# Altium footprint library adafruit.PCBLIB: 648 footprints (part 41 of 41)
Each footprint in its own frame and in the unit in brackets; x right, y up, seen from the top. Pads: shape width x height; smd on the part's side, far side on the other; paste and mask are expansions set on the pad; w line width, h text height; cw(c..) or ccw(c..) is an arc to the next point about the centre after c.
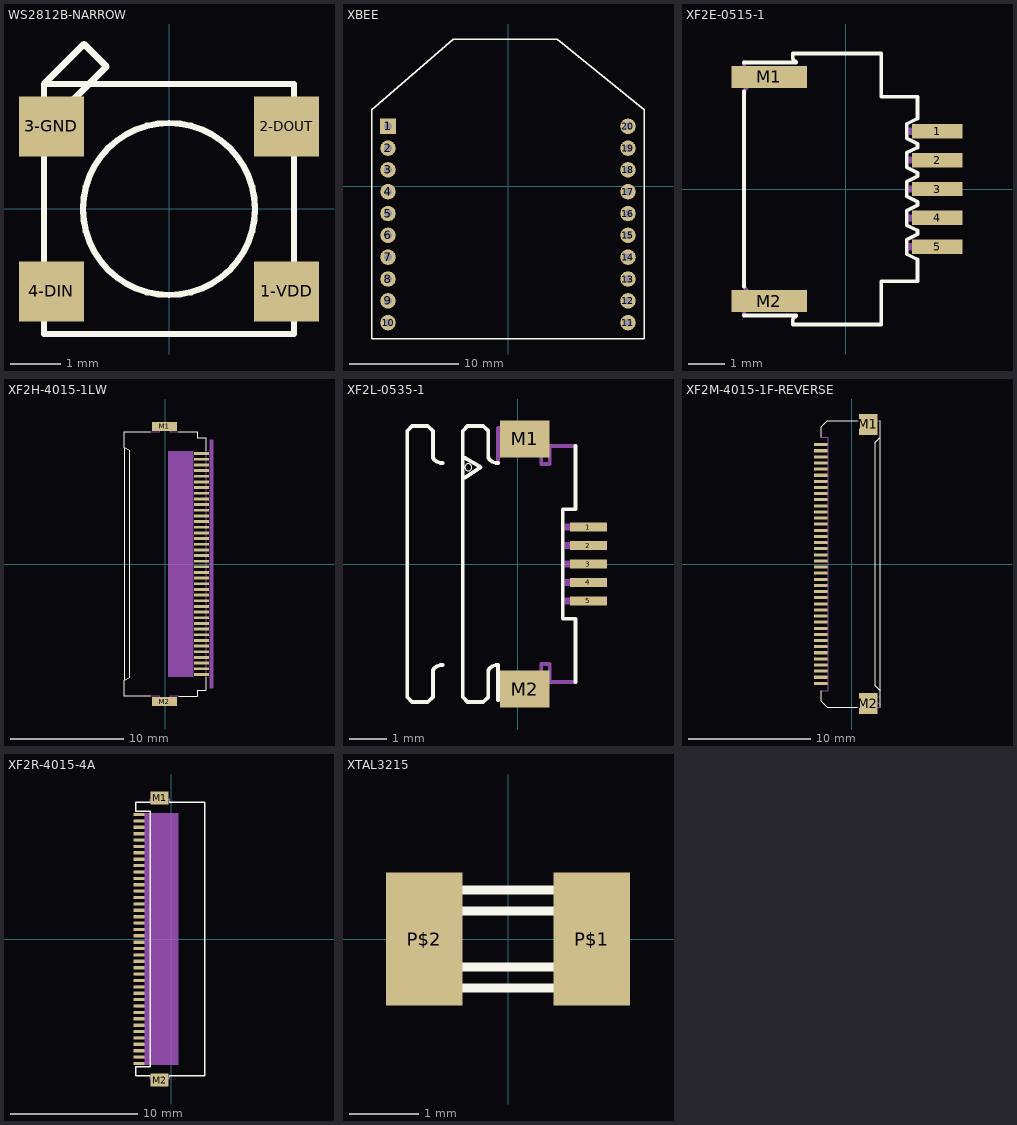
[diagram p40: the footprints below, top view; thin cyan lines are the x and y axes]

## WS2812B-NARROW [mm]
pads (4):
  rect 1.3x1.2 smd: 1-VDD(2.35,-1.65) 2-DOUT(2.35,1.65) 3-GND(-2.35,1.65) 4-DIN(-2.35,-1.65)
Top Overlay:
  circle w0.127: c0,0 r1.72
  lines w0.127: -2.5,1.6 -2.5,-2.5 2.5,-2.5 2.5,2.5 -1.6,2.5 ; -2.5,1.6 -2.5,2.5 ; -2.5,1.6 -1.6,2.5 ; -2.5,2.5 -1.6,2.5 ; -2.5,2.5 -1.7,3.3 -1.25,2.85 -1.6,2.5

## XBEE [mil]
pads (20):
  rect 56x56 hole 27.56: 1(-433.07,216.54)
  round 56 hole 27.56: 2(-433.07,137.8) 3(-433.07,59.06) 4(-433.07,-19.69) 5(-433.07,-98.43) 6(-433.07,-177.17) 7(-433.07,-255.91) 8(-433.07,-334.65) 9(-433.07,-413.39) 10(-433.07,-492.13) 11(433.07,-492.13) 12(433.07,-413.39) 13(433.07,-334.65) 14(433.07,-255.91) 15(433.07,-177.17) 16(433.07,-98.43) 17(433.07,-19.69) 18(433.07,59.06) 19(433.07,137.8) 20(433.07,216.54)
Top Overlay:
  lines w5: -492.13,-551.18 492.13,-551.18 492.13,275.59 177.17,531.5 -196.85,531.5 -492.13,275.59 -492.13,-551.18

## XF2E-0515-1 [mil]
pads (7):
  rect 55.12x15.75 smd: 1(100,62.99) 2(100,31.5) 3(100,0) 4(100,-31.5) 5(100,-62.99)
  rect 82.68x23.62 smd: M1(-83.07,122.05) M2(-83.07,-122.05)
Top Overlay:
  lines w4: -110.63,-137.8 -53.54,-137.8 -57.48,-141.73 -57.48,-147.64 38.98,-147.64 38.98,-100.39 78.35,-100.39 78.35,-76.77 66.54,-70.87 66.54,-55.12 78.35,-49.21 78.35,-45.28 66.54,-39.37 66.54,-23.62 78.35,-17.72 78.35,-13.78 66.54,-7.87 66.54,7.87 78.35,13.78 78.35,17.72 66.54,23.62 66.54,39.37 78.35,45.28 78.35,49.21 66.54,55.12 66.54,70.87 78.35,76.77 78.35,100.39 38.98,100.39 38.98,147.64 -57.48,147.64 -57.48,141.73 -53.54,137.8 -110.63,137.8 ; -110.63,-106.3 -110.63,106.3
Mechanical 16:
  rectangle: 68.5,-66.93 107.87,-59.06
  rectangle: 68.5,-35.43 107.87,-27.56
  rectangle: 68.5,-3.94 107.87,3.94
  rectangle: 68.5,27.56 107.87,35.43
  rectangle: 68.5,59.06 107.87,66.93
  lines w4: -110.63,-137.8 -110.63,-116.14 -102.76,-116.14 -110.63,-106.3 ; -110.63,106.3 -102.76,116.14 -110.63,116.14 -110.63,137.8

## XF2H-4015-1LW [mil]
pads (42):
  rect 51.18x9.84 smd: 1(125,383.86) 2(125,364.17) 3(125,344.49) 4(125,324.8) 5(125,305.12) 6(125,285.43) 7(125,265.75) 8(125,246.06) 9(125,226.38) 10(125,206.69) 11(125,187.01) 12(125,167.32) 13(125,147.64) 14(125,127.95) 15(125,108.27) 16(125,88.58) 17(125,68.9) 18(125,49.21) 19(125,29.53) 20(125,9.84) 21(125,-9.84) 22(125,-29.53) 23(125,-49.21) 24(125,-68.9) 25(125,-88.58) 26(125,-108.27) 27(125,-127.95) 28(125,-147.64) 29(125,-167.32) 30(125,-187.01) 31(125,-206.69) 32(125,-226.38) 33(125,-246.06) 34(125,-265.75) 35(125,-285.43) 36(125,-305.12) 37(125,-324.8) 38(125,-344.49) 39(125,-364.17) 40(125,-383.86)
  rect 86.61x31.5 smd: M1(-2.95,478.35) M2(-2.95,-478.35)
Top Overlay:
  lines w4: -52.17,-460.63 -142.72,-460.63 -142.72,-403.54 ; -52.17,460.63 -142.72,460.63 -142.72,403.54 ; 46.26,-460.63 111.22,-460.63 111.22,-438.98 140.75,-438.98 140.75,-393.7 ; 46.26,460.63 111.22,460.63 111.22,438.98 140.75,438.98 140.75,393.7 ; -142.72,-403.54 -125,-393.7 -125,393.7 -142.72,403.54 ; -142.72,-403.54 -142.72,403.54
Top Solder:
  rectangle: 97.44,376.97 152.56,390.75
  rectangle: 97.44,357.28 152.56,371.06
  rectangle: 97.44,337.6 152.56,351.38
  rectangle: 97.44,317.91 152.56,331.69
  rectangle: 97.44,298.23 152.56,312.01
  rectangle: 97.44,278.54 152.56,292.32
  rectangle: 97.44,258.86 152.56,272.64
  rectangle: 97.44,239.17 152.56,252.95
  rectangle: 97.44,219.49 152.56,233.27
  rectangle: 97.44,199.8 152.56,213.58
  rectangle: 97.44,180.12 152.56,193.9
  rectangle: 97.44,160.43 152.56,174.21
  rectangle: 97.44,140.75 152.56,154.53
  rectangle: 97.44,121.06 152.56,134.84
  rectangle: 97.44,101.38 152.56,115.16
  rectangle: 97.44,81.69 152.56,95.47
  rectangle: 97.44,62.01 152.56,75.79
  rectangle: 97.44,42.32 152.56,56.1
  rectangle: 97.44,22.64 152.56,36.42
  rectangle: 97.44,2.95 152.56,16.73
  rectangle: 97.44,-16.73 152.56,-2.95
  rectangle: 97.44,-36.42 152.56,-22.64
  rectangle: 97.44,-56.1 152.56,-42.32
  rectangle: 97.44,-75.79 152.56,-62.01
  rectangle: 97.44,-95.47 152.56,-81.69
  rectangle: 97.44,-115.16 152.56,-101.38
  rectangle: 97.44,-134.84 152.56,-121.06
  rectangle: 97.44,-154.53 152.56,-140.75
  rectangle: 97.44,-174.21 152.56,-160.43
  rectangle: 97.44,-193.9 152.56,-180.12
  rectangle: 97.44,-213.58 152.56,-199.8
  rectangle: 97.44,-233.27 152.56,-219.49
  rectangle: 97.44,-252.95 152.56,-239.17
  rectangle: 97.44,-272.64 152.56,-258.86
  rectangle: 97.44,-292.32 152.56,-278.54
  rectangle: 97.44,-312.01 152.56,-298.23
  rectangle: 97.44,-331.69 152.56,-317.91
  rectangle: 97.44,-351.38 152.56,-337.6
  rectangle: 97.44,-371.06 152.56,-357.28
  rectangle: 97.44,-390.75 152.56,-376.97
Mechanical 10:
  rectangle: 8.86,-393.7 97.44,393.7
Mechanical 16:
  lines w4: -52.17,-460.63 -20.67,-460.63 -20.67,-472.44 14.76,-472.44 14.76,-460.63 46.26,-460.63 ; -52.17,460.63 -20.67,460.63 -20.67,472.44 14.76,472.44 14.76,460.63 46.26,460.63 ; 140.75,-393.7 140.75,393.7
Mechanical 27:
  rectangle: 152.56,-433.07 167.32,433.07

## XF2L-0535-1 [mm]
pads (7):
  rect 1x0.25 smd: 1(1.905,1) 2(1.905,0.5) 3(1.905,0) 4(1.905,-0.5) 5(1.905,-1)
  rect 1.34x1 smd: M1(0.18,3.388) M2(0.18,-3.388)
Top Overlay:
  circle w0: c-1.341,2.617 r0.095
  lines w0.102: -2.04,-2.731 ccw(c-2.04,-3.069) -2.253,-2.806 ccw(c-2.173,-2.906) -2.301,-2.906 -2.301,-3.598 -2.438,-3.735 -2.865,-3.735 -2.995,-3.6 -2.995,3.6 -2.865,3.735 -2.438,3.735 -2.301,3.598 -2.301,2.906 ccw(c-2.173,2.906) -2.253,2.806 ccw(c-2.04,3.069) -2.04,2.731 ; -1.441,2.332 -1.005,2.617 -1.441,2.872 ; -0.54,-3.683 -0.54,-2.73 ccw(c-0.54,-3.069) -0.754,-2.806 ccw(c-0.673,-2.906) -0.801,-2.906 -0.801,-3.598 -0.939,-3.735 -1.365,-3.735 -1.495,-3.6 -1.495,3.6 -1.365,3.735 -0.939,3.735 -0.801,3.598 -0.801,2.906 ccw(c-0.673,2.906) -0.754,2.806 ccw(c-0.54,3.069) -0.54,2.731 ; 1.538,1.479 1.213,1.479 1.213,-1.479 1.559,-1.479 1.559,-3.19 ; 1.559,1.479 1.559,3.19
Top Solder:
  rectangle: 1.355,0.825 2.455,1.175
  rectangle: 1.355,0.325 2.455,0.675
  rectangle: 1.355,-0.175 2.455,0.175
  rectangle: 1.355,-0.675 2.455,-0.325
  rectangle: 1.355,-1.175 2.455,-0.825
Mechanical 16:
  rectangle: 0.105,-3.7 0.805,-3.175
  rectangle: -0.445,-3.7 0.105,-2.9
  rectangle: 0.105,-3.7 0.805,-3.175
  rectangle: -0.445,-3.7 0.105,-2.9
  rectangle: 0.105,3.175 0.805,3.7
  rectangle: -0.445,2.9 0.105,3.7
  rectangle: 1.255,0.9 1.98,1.1
  rectangle: 1.255,0.4 1.98,0.6
  rectangle: 1.255,-0.1 1.98,0.1
  rectangle: 1.255,-0.6 1.98,-0.4
  rectangle: 1.255,-1.1 1.98,-0.9
  lines w0.102: -0.54,-3.683 0.512,-3.683 0.512,-3.2 -0.019,-3.2 -0.019,-3.053 0.63,-3.053 0.63,-2.707 0.858,-2.707 0.858,-3.19 1.559,-3.19 ; -0.54,2.73 -0.54,3.683 0.512,3.683 0.512,3.2 -0.019,3.2 -0.019,3.053 0.63,3.053 0.63,2.707 0.858,2.707 0.858,3.19 1.559,3.19
  text "Lower-contact" at -0.5,2.25 h0.35

## XF2M-4015-1F-REVERSE [mil]
pads (42):
  rect 43.31x9.84 smd: 1(-100,383.86) 2(-100,364.17) 3(-100,344.49) 4(-100,324.8) 5(-100,305.12) 6(-100,285.43) 7(-100,265.75) 8(-100,246.06) 9(-100,226.38) 10(-100,206.69) 11(-100,187.01) 12(-100,167.32) 13(-100,147.64) 14(-100,127.95) 15(-100,108.27) 16(-100,88.58) 17(-100,68.9) 18(-100,49.21) 19(-100,29.53) 20(-100,9.84) 21(-100,-9.84) 22(-100,-29.53) 23(-100,-49.21) 24(-100,-68.9) 25(-100,-88.58) 26(-100,-108.27) 27(-100,-127.95) 28(-100,-147.64) 29(-100,-167.32) 30(-100,-187.01) 31(-100,-206.69) 32(-100,-226.38) 33(-100,-246.06) 34(-100,-265.75) 35(-100,-285.43) 36(-100,-305.12) 37(-100,-324.8) 38(-100,-344.49) 39(-100,-364.17) 40(-100,-383.86)
  rect 59.06x66.93 smd: M1(53.54,448.82) M2(53.54,-448.82)
Top Overlay:
  lines w4: -98.03,-407.48 -98.03,-440.94 -78.35,-460.63 18.11,-460.63 ; -98.03,407.48 -98.03,440.94 -78.35,460.63 18.11,460.63 ; 90.94,-460.63 90.94,-407.48 ; 90.94,460.63 90.94,407.48 ; 90.94,-407.48 90.94,407.48 ; 90.94,-407.48 75.2,-391.73 75.2,391.73 90.94,407.48
Mechanical 16:
  region: -77.36,386.81 -111.81,386.81 -111.81,380.91 -77.36,380.91
  region: -77.36,367.13 -111.81,367.13 -111.81,361.22 -77.36,361.22
  region: -77.36,347.44 -111.81,347.44 -111.81,341.54 -77.36,341.54
  region: -77.36,327.76 -111.81,327.76 -111.81,321.85 -77.36,321.85
  region: -77.36,308.07 -111.81,308.07 -111.81,302.17 -77.36,302.17
  region: -77.36,288.39 -111.81,288.39 -111.81,282.48 -77.36,282.48
  region: -77.36,268.7 -111.81,268.7 -111.81,262.8 -77.36,262.8
  region: -77.36,249.02 -111.81,249.02 -111.81,243.11 -77.36,243.11
  region: -77.36,229.33 -111.81,229.33 -111.81,223.43 -77.36,223.43
  region: -77.36,209.65 -111.81,209.65 -111.81,203.74 -77.36,203.74
  region: -77.36,189.96 -111.81,189.96 -111.81,184.06 -77.36,184.06
  region: -77.36,170.28 -111.81,170.28 -111.81,164.37 -77.36,164.37
  region: -77.36,150.59 -111.81,150.59 -111.81,144.69 -77.36,144.69
  region: -77.36,130.91 -111.81,130.91 -111.81,125 -77.36,125
  region: -77.36,111.22 -111.81,111.22 -111.81,105.32 -77.36,105.32
  region: -77.36,91.54 -111.81,91.54 -111.81,85.63 -77.36,85.63
  region: -77.36,71.85 -111.81,71.85 -111.81,65.94 -77.36,65.94
  region: -77.36,52.17 -111.81,52.17 -111.81,46.26 -77.36,46.26
  region: -77.36,32.48 -111.81,32.48 -111.81,26.57 -77.36,26.57
  region: -77.36,12.8 -111.81,12.8 -111.81,6.89 -77.36,6.89
  region: -77.36,-6.89 -111.81,-6.89 -111.81,-12.8 -77.36,-12.8
  region: -77.36,-26.57 -111.81,-26.57 -111.81,-32.48 -77.36,-32.48
  region: -77.36,-46.26 -111.81,-46.26 -111.81,-52.17 -77.36,-52.17
  region: -77.36,-65.94 -111.81,-65.94 -111.81,-71.85 -77.36,-71.85
  region: -77.36,-85.63 -111.81,-85.63 -111.81,-91.54 -77.36,-91.54
  region: -77.36,-105.32 -111.81,-105.32 -111.81,-111.22 -77.36,-111.22
  region: -77.36,-125 -111.81,-125 -111.81,-130.91 -77.36,-130.91
  region: -77.36,-144.69 -111.81,-144.69 -111.81,-150.59 -77.36,-150.59
  region: -77.36,-164.37 -111.81,-164.37 -111.81,-170.28 -77.36,-170.28
  region: -77.36,-184.06 -111.81,-184.06 -111.81,-189.96 -77.36,-189.96
  region: -77.36,-203.74 -111.81,-203.74 -111.81,-209.65 -77.36,-209.65
  region: -77.36,-223.43 -111.81,-223.43 -111.81,-229.33 -77.36,-229.33
  region: -77.36,-243.11 -111.81,-243.11 -111.81,-249.02 -77.36,-249.02
  region: -77.36,-262.8 -111.81,-262.8 -111.81,-268.7 -77.36,-268.7
  region: -77.36,-282.48 -111.81,-282.48 -111.81,-288.39 -77.36,-288.39
  region: -77.36,-302.17 -111.81,-302.17 -111.81,-308.07 -77.36,-308.07
  region: -77.36,-321.85 -111.81,-321.85 -111.81,-327.76 -77.36,-327.76
  region: -77.36,-341.54 -111.81,-341.54 -111.81,-347.44 -77.36,-347.44
  region: -77.36,-361.22 -111.81,-361.22 -111.81,-367.13 -77.36,-367.13
  region: -77.36,-380.91 -111.81,-380.91 -111.81,-386.81 -77.36,-386.81
  lines w4: -98.03,-407.48 -75.39,-407.48 -75.39,407.48 -98.03,407.48 ; 18.11,-460.63 35.83,-460.63 35.83,-472.44 75.2,-472.44 75.2,-460.63 90.94,-460.63 ; 18.11,460.63 35.83,460.63 35.83,472.44 75.2,472.44 75.2,460.63 90.94,460.63 ; 90.94,-450.79 67.32,-437.01 90.94,-423.23

## XF2R-4015-4A [mm]
pads (42):
  rect 0.85x0.25 smd: 1(-2.54,9.75) 2(-2.54,9.25) 3(-2.54,8.75) 4(-2.54,8.25) 5(-2.54,7.75) 6(-2.54,7.25) 7(-2.54,6.75) 8(-2.54,6.25) 9(-2.54,5.75) 10(-2.54,5.25) 11(-2.54,4.75) 12(-2.54,4.25) 13(-2.54,3.75) 14(-2.54,3.25) 15(-2.54,2.75) 16(-2.54,2.25) 17(-2.54,1.75) 18(-2.54,1.25) 19(-2.54,0.75) 20(-2.54,0.25) 21(-2.54,-0.25) 22(-2.54,-0.75) 23(-2.54,-1.25) 24(-2.54,-1.75) 25(-2.54,-2.25) 26(-2.54,-2.75) 27(-2.54,-3.25) 28(-2.54,-3.75) 29(-2.54,-4.25) 30(-2.54,-4.75) 31(-2.54,-5.25) 32(-2.54,-5.75) 33(-2.54,-6.25) 34(-2.54,-6.75) 35(-2.54,-7.25) 36(-2.54,-7.75) 37(-2.54,-8.25) 38(-2.54,-8.75) 39(-2.54,-9.25) 40(-2.54,-9.75)
  rect 1.4x1 smd: M1(-0.915,11.05) M2(-0.915,-11.05)
Top Overlay:
  lines w0.102: -1.665,-10.725 -2.765,-10.725 -2.765,-10 -1.665,-10 -1.665,10 -2.765,10 -2.765,10.725 -1.665,10.725 ; -0.165,-10.725 2.635,-10.725 2.635,10.725 -0.165,10.725
Top Solder:
  rectangle: -2.99,9.6 -2.09,9.9
  rectangle: -2.99,9.1 -2.09,9.4
  rectangle: -2.99,8.6 -2.09,8.9
  rectangle: -2.99,8.1 -2.09,8.4
  rectangle: -2.99,7.6 -2.09,7.9
  rectangle: -2.99,7.1 -2.09,7.4
  rectangle: -2.99,6.6 -2.09,6.9
  rectangle: -2.99,6.1 -2.09,6.4
  rectangle: -2.99,5.6 -2.09,5.9
  rectangle: -2.99,5.1 -2.09,5.4
  rectangle: -2.99,4.6 -2.09,4.9
  rectangle: -2.99,4.1 -2.09,4.4
  rectangle: -2.99,3.6 -2.09,3.9
  rectangle: -2.99,3.1 -2.09,3.4
  rectangle: -2.99,2.6 -2.09,2.9
  rectangle: -2.99,2.1 -2.09,2.4
  rectangle: -2.99,1.6 -2.09,1.9
  rectangle: -2.99,1.1 -2.09,1.4
  rectangle: -2.99,0.6 -2.09,0.9
  rectangle: -2.99,0.1 -2.09,0.4
  rectangle: -2.99,-0.4 -2.09,-0.1
  rectangle: -2.99,-0.9 -2.09,-0.6
  rectangle: -2.99,-1.4 -2.09,-1.1
  rectangle: -2.99,-1.9 -2.09,-1.6
  rectangle: -2.99,-2.4 -2.09,-2.1
  rectangle: -2.99,-2.9 -2.09,-2.6
  rectangle: -2.99,-3.4 -2.09,-3.1
  rectangle: -2.99,-3.9 -2.09,-3.6
  rectangle: -2.99,-4.4 -2.09,-4.1
  rectangle: -2.99,-4.9 -2.09,-4.6
  rectangle: -2.99,-5.4 -2.09,-5.1
  rectangle: -2.99,-5.9 -2.09,-5.6
  rectangle: -2.99,-6.4 -2.09,-6.1
  rectangle: -2.99,-6.9 -2.09,-6.6
  rectangle: -2.99,-7.4 -2.09,-7.1
  rectangle: -2.99,-7.9 -2.09,-7.6
  rectangle: -2.99,-8.4 -2.09,-8.1
  rectangle: -2.99,-8.9 -2.09,-8.6
  rectangle: -2.99,-9.4 -2.09,-9.1
  rectangle: -2.99,-9.9 -2.09,-9.6
Mechanical 10:
  region: 0.585,9.875 -2.09,9.875 -2.09,-9.875 0.585,-9.875
Mechanical 16:
  rectangle: -2.815,9.65 -1.715,9.85
  rectangle: -2.815,9.15 -1.715,9.35
  rectangle: -2.815,8.65 -1.715,8.85
  rectangle: -2.815,8.15 -1.715,8.35
  rectangle: -2.815,7.65 -1.715,7.85
  rectangle: -2.815,7.15 -1.715,7.35
  rectangle: -2.815,6.65 -1.715,6.85
  rectangle: -2.815,6.15 -1.715,6.35
  rectangle: -2.815,5.65 -1.715,5.85
  rectangle: -2.815,5.15 -1.715,5.35
  rectangle: -2.815,4.65 -1.715,4.85
  rectangle: -2.815,4.15 -1.715,4.35
  rectangle: -2.815,3.65 -1.715,3.85
  rectangle: -2.815,3.15 -1.715,3.35
  rectangle: -2.815,2.65 -1.715,2.85
  rectangle: -2.815,2.15 -1.715,2.35
  rectangle: -2.815,1.65 -1.715,1.85
  rectangle: -2.815,1.15 -1.715,1.35
  rectangle: -2.815,0.65 -1.715,0.85
  rectangle: -2.815,0.15 -1.715,0.35
  rectangle: -2.815,-0.35 -1.715,-0.15
  rectangle: -2.815,-0.85 -1.715,-0.65
  rectangle: -2.815,-1.35 -1.715,-1.15
  rectangle: -2.815,-1.85 -1.715,-1.65
  rectangle: -2.815,-2.35 -1.715,-2.15
  rectangle: -2.815,-2.85 -1.715,-2.65
  rectangle: -2.815,-3.35 -1.715,-3.15
  rectangle: -2.815,-3.85 -1.715,-3.65
  rectangle: -2.815,-4.35 -1.715,-4.15
  rectangle: -2.815,-4.85 -1.715,-4.65
  rectangle: -2.815,-5.35 -1.715,-5.15
  rectangle: -2.815,-5.85 -1.715,-5.65
  rectangle: -2.815,-6.35 -1.715,-6.15
  rectangle: -2.815,-6.85 -1.715,-6.65
  rectangle: -2.815,-7.35 -1.715,-7.15
  rectangle: -2.815,-7.85 -1.715,-7.65
  rectangle: -2.815,-8.35 -1.715,-8.15
  rectangle: -2.815,-8.85 -1.715,-8.65
  rectangle: -2.815,-9.35 -1.715,-9.15
  rectangle: -2.815,-9.85 -1.715,-9.65
  lines w0.102: -1.665,-10.725 -1.665,-10.95 -1.365,-10.95 -1.365,-11.45 -1.265,-11.45 -1.165,-11.35 -0.665,-11.35 -0.565,-11.45 -0.465,-11.45 -0.465,-10.95 -0.165,-10.95 -0.165,-10.725 ; -1.665,10.725 -1.665,10.95 -1.365,10.95 -1.365,11.45 -1.265,11.45 -1.165,11.35 -0.665,11.35 -0.565,11.45 -0.465,11.45 -0.465,10.95 -0.165,10.95 -0.165,10.725

## XTAL3215 [mil]
pads (2):
  rect 43.31x74.8 smd: P$1(47.24,0) P$2(-47.24,0)
Top Overlay:
  lines w5: -62.99,-16.43 ccw(c-51.86,-16.43) -51.86,-27.56 51.86,-27.56 ccw(c51.86,-16.43) 62.99,-16.43 62.99,15.11 ccw(c50.54,15.11) 50.54,27.56 -54.19,27.56 ccw(c-54.19,18.76) -62.99,18.76 -62.99,-16.43 ; -51.18,-7.87 ccw(c-41.34,-5.91) -39.37,-15.75 39.37,-15.75 ccw(c39.37,-3.94) 51.18,-3.94 51.18,3.94 ccw(c39.37,3.94) 39.37,15.75 -43.31,15.75 ccw(c-41.34,5.91) -51.18,3.94 -51.18,-7.87